# Altium schematic symbol library jlcpcb_2025_04_capacitors_extended_0603.schlib: 3668 symbols (part 10 of 20) (continued)
## CC0603JRX7R7BB823
designator C?  Capacitance: 82nF  (hidden comment: *)
Capacitor, Ceramic (MLCC), 82nF, ±5%, 16V, X7R, ±5%, SMD 0603; Manufacturer: YAGEO; Manufacturer Part Number: CC0603JRX7R7BB823; Package Size: 0603; JLCPCB Basic Part: No; JLCPCB Part Number: C519539; Supplier 1: LCSC; Category: Capacitors - MLCC; Supplier Part Number 1: C519539; Tolerance: ±5%; Voltage Rating: 16V; Temperature Coefficient: X7R; RoHS: Yes; ComponentLink1Description: Datasheet; ComponentLink1URL: https://wmsc.lcsc.com/wmsc/upload/file/pdf/v2/lcsc/2006011835_YAGEO-CC0603JRX7R7BB823_C519539.pdf; ComponentLink2Description: JLCPCB Part URL; ComponentLink2URL: https://jlcpcb.com/partdetail/C519539; ComponentLink3Description: LCSC Part URL; ComponentLink3URL: https://lcsc.com/product-detail/Multilayer-Ceramic-Capacitors-MLCC---SMD-SMT_YAGEO-YAGEO-CC0603JRX7R7BB823_C519539.html
footprint CAP-0603 (0603 (1608M) Capacitor)
pins: 1, 2

## CC0603JRX7R8BB102
designator C?  Capacitance: 1nF  (hidden comment: *)
Capacitor, Ceramic (MLCC), 1nF, ±5%, 25V, X7R, ±5%, SMD 0603; Manufacturer: YAGEO; Manufacturer Part Number: CC0603JRX7R8BB102; Package Size: 0603; JLCPCB Basic Part: No; JLCPCB Part Number: C519508; Supplier 1: LCSC; Category: Capacitors - MLCC; Supplier Part Number 1: C519508; Tolerance: ±5%; Voltage Rating: 25V; Temperature Coefficient: X7R; RoHS: Yes; ComponentLink1Description: Datasheet; ComponentLink1URL: https://wmsc.lcsc.com/wmsc/upload/file/pdf/v2/lcsc/2005181835_YAGEO-CC0603JRX7R8BB102_C519508.pdf; ComponentLink2Description: JLCPCB Part URL; ComponentLink2URL: https://jlcpcb.com/partdetail/C519508; ComponentLink3Description: LCSC Part URL; ComponentLink3URL: https://lcsc.com/product-detail/Multilayer-Ceramic-Capacitors-MLCC---SMD-SMT_YAGEO-YAGEO-CC0603JRX7R8BB102_C519508.html
footprint CAP-0603 (0603 (1608M) Capacitor)
pins: 1, 2

## CC0603JRX7R8BB103
designator C?  Capacitance: 10nF  (hidden comment: *)
Capacitor, Ceramic (MLCC), 10nF, ±5%, 25V, X7R, ±5%, SMD 0603; Manufacturer: YAGEO; Manufacturer Part Number: CC0603JRX7R8BB103; Package Size: 0603; JLCPCB Basic Part: No; JLCPCB Part Number: C519510; Supplier 1: LCSC; Category: Capacitors - MLCC; Supplier Part Number 1: C519510; Tolerance: ±5%; Voltage Rating: 25V; Temperature Coefficient: X7R; RoHS: Yes; ComponentLink1Description: Datasheet; ComponentLink1URL: https://wmsc.lcsc.com/wmsc/upload/file/pdf/v2/lcsc/2005181835_YAGEO-CC0603JRX7R8BB103_C519510.pdf; ComponentLink2Description: JLCPCB Part URL; ComponentLink2URL: https://jlcpcb.com/partdetail/C519510; ComponentLink3Description: LCSC Part URL; ComponentLink3URL: https://lcsc.com/product-detail/Multilayer-Ceramic-Capacitors-MLCC---SMD-SMT_YAGEO-YAGEO-CC0603JRX7R8BB103_C519510.html
footprint CAP-0603 (0603 (1608M) Capacitor)
pins: 1, 2

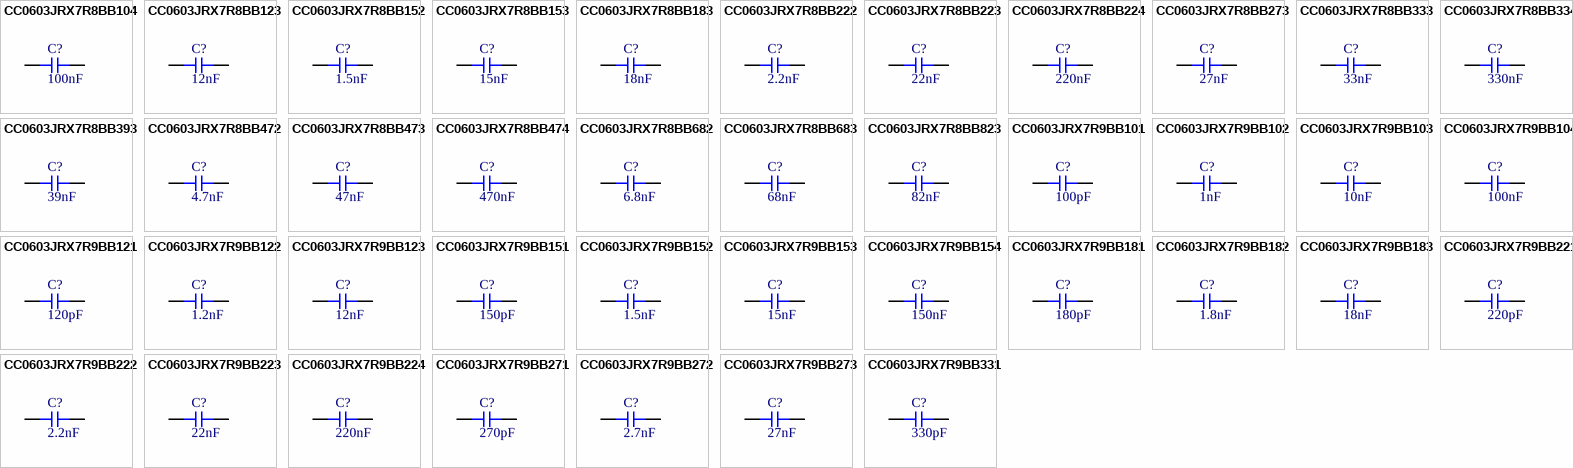
[diagram p43: symbols CC0603JRX7R8BB104 to CC0603JRX7R9BB331]

## CC0603JRX7R8BB104
designator C?  Capacitance: 100nF  (hidden comment: *)
Capacitor, Ceramic (MLCC), 100nF, ±5%, 25V, X7R, ±5%, SMD 0603; Manufacturer: YAGEO; Manufacturer Part Number: CC0603JRX7R8BB104; Package Size: 0603; JLCPCB Basic Part: No; JLCPCB Part Number: C327087; Supplier 1: LCSC; Category: Capacitors - MLCC; Supplier Part Number 1: C327087; Tolerance: ±5%; Voltage Rating: 25V; Temperature Coefficient: X7R; RoHS: Yes; ComponentLink1Description: Datasheet; ComponentLink1URL: https://wmsc.lcsc.com/wmsc/upload/file/pdf/v2/lcsc/1811141242_YAGEO-CC0603JRX7R8BB104_C327087.pdf; ComponentLink2Description: JLCPCB Part URL; ComponentLink2URL: https://jlcpcb.com/partdetail/C327087; ComponentLink3Description: LCSC Part URL; ComponentLink3URL: https://lcsc.com/product-detail/Multilayer-Ceramic-Capacitors-MLCC---SMD-SMT_YAGEO-YAGEO-CC0603JRX7R8BB104_C327087.html
footprint CAP-0603 (0603 (1608M) Capacitor)
pins: 1, 2

## CC0603JRX7R8BB123
designator C?  Capacitance: 12nF  (hidden comment: *)
Capacitor, Ceramic (MLCC), 12nF, ±5%, 25V, X7R, ±5%, SMD 0603; Manufacturer: YAGEO; Manufacturer Part Number: CC0603JRX7R8BB123; Package Size: 0603; JLCPCB Basic Part: No; JLCPCB Part Number: C519540; Supplier 1: LCSC; Category: Capacitors - MLCC; Supplier Part Number 1: C519540; Tolerance: ±5%; Voltage Rating: 25V; Temperature Coefficient: X7R; RoHS: Yes; ComponentLink1Description: Datasheet; ComponentLink1URL: https://wmsc.lcsc.com/wmsc/upload/file/pdf/v2/lcsc/2007161234_YAGEO-CC0603JRX7R8BB123_C519540.pdf; ComponentLink2Description: JLCPCB Part URL; ComponentLink2URL: https://jlcpcb.com/partdetail/C519540; ComponentLink3Description: LCSC Part URL; ComponentLink3URL: https://lcsc.com/product-detail/Multilayer-Ceramic-Capacitors-MLCC---SMD-SMT_YAGEO-YAGEO-CC0603JRX7R8BB123_C519540.html
footprint CAP-0603 (0603 (1608M) Capacitor)
pins: 1, 2

## CC0603JRX7R8BB152
designator C?  Capacitance: 1.5nF  (hidden comment: *)
Capacitor, Ceramic (MLCC), 1.5nF, ±5%, 25V, X7R, ±5%, SMD 0603; Manufacturer: YAGEO; Manufacturer Part Number: CC0603JRX7R8BB152; Package Size: 0603; JLCPCB Basic Part: No; JLCPCB Part Number: C519521; Supplier 1: LCSC; Category: Capacitors - MLCC; Supplier Part Number 1: C519521; Tolerance: ±5%; Voltage Rating: 25V; Temperature Coefficient: X7R; RoHS: Yes; ComponentLink1Description: Datasheet; ComponentLink1URL: https://wmsc.lcsc.com/wmsc/upload/file/pdf/v2/lcsc/2008031233_YAGEO-CC0603JRX7R8BB152_C519521.pdf; ComponentLink2Description: JLCPCB Part URL; ComponentLink2URL: https://jlcpcb.com/partdetail/C519521; ComponentLink3Description: LCSC Part URL; ComponentLink3URL: https://lcsc.com/product-detail/Multilayer-Ceramic-Capacitors-MLCC---SMD-SMT_YAGEO-YAGEO-CC0603JRX7R8BB152_C519521.html
footprint CAP-0603 (0603 (1608M) Capacitor)
pins: 1, 2

## CC0603JRX7R8BB153
designator C?  Capacitance: 15nF  (hidden comment: *)
Capacitor, Ceramic (MLCC), 15nF, ±5%, 25V, X7R, ±5%, SMD 0603; Manufacturer: YAGEO; Manufacturer Part Number: CC0603JRX7R8BB153; Package Size: 0603; JLCPCB Basic Part: No; JLCPCB Part Number: C519541; Supplier 1: LCSC; Category: Capacitors - MLCC; Supplier Part Number 1: C519541; Tolerance: ±5%; Voltage Rating: 25V; Temperature Coefficient: X7R; RoHS: Yes; ComponentLink1Description: Datasheet; ComponentLink1URL: https://wmsc.lcsc.com/wmsc/upload/file/pdf/v2/lcsc/2007231533_YAGEO-CC0603JRX7R8BB153_C519541.pdf; ComponentLink2Description: JLCPCB Part URL; ComponentLink2URL: https://jlcpcb.com/partdetail/C519541; ComponentLink3Description: LCSC Part URL; ComponentLink3URL: https://lcsc.com/product-detail/Multilayer-Ceramic-Capacitors-MLCC---SMD-SMT_YAGEO-YAGEO-CC0603JRX7R8BB153_C519541.html
footprint CAP-0603 (0603 (1608M) Capacitor)
pins: 1, 2

## CC0603JRX7R8BB183
designator C?  Capacitance: 18nF  (hidden comment: *)
Capacitor, Ceramic (MLCC), 18nF, ±5%, 25V, X7R, ±5%, SMD 0603; Manufacturer: YAGEO; Manufacturer Part Number: CC0603JRX7R8BB183; Package Size: 0603; JLCPCB Basic Part: No; JLCPCB Part Number: C519542; Supplier 1: LCSC; Category: Capacitors - MLCC; Supplier Part Number 1: C519542; Tolerance: ±5%; Voltage Rating: 25V; Temperature Coefficient: X7R; RoHS: Yes; ComponentLink1Description: Datasheet; ComponentLink1URL: https://wmsc.lcsc.com/wmsc/upload/file/pdf/v2/lcsc/2008031233_YAGEO-CC0603JRX7R8BB183_C519542.pdf; ComponentLink2Description: JLCPCB Part URL; ComponentLink2URL: https://jlcpcb.com/partdetail/C519542; ComponentLink3Description: LCSC Part URL; ComponentLink3URL: https://lcsc.com/product-detail/Multilayer-Ceramic-Capacitors-MLCC---SMD-SMT_YAGEO-YAGEO-CC0603JRX7R8BB183_C519542.html
footprint CAP-0603 (0603 (1608M) Capacitor)
pins: 1, 2

## CC0603JRX7R8BB222
designator C?  Capacitance: 2.2nF  (hidden comment: *)
Capacitor, Ceramic (MLCC), 2.2nF, ±5%, 25V, X7R, ±5%, SMD 0603; Manufacturer: YAGEO; Manufacturer Part Number: CC0603JRX7R8BB222; Package Size: 0603; JLCPCB Basic Part: No; JLCPCB Part Number: C519522; Supplier 1: LCSC; Category: Capacitors - MLCC; Supplier Part Number 1: C519522; Tolerance: ±5%; Voltage Rating: 25V; Temperature Coefficient: X7R; RoHS: Yes; ComponentLink1Description: Datasheet; ComponentLink1URL: https://wmsc.lcsc.com/wmsc/upload/file/pdf/v2/lcsc/2008031233_YAGEO-CC0603JRX7R8BB222_C519522.pdf; ComponentLink2Description: JLCPCB Part URL; ComponentLink2URL: https://jlcpcb.com/partdetail/C519522; ComponentLink3Description: LCSC Part URL; ComponentLink3URL: https://lcsc.com/product-detail/Multilayer-Ceramic-Capacitors-MLCC---SMD-SMT_YAGEO-YAGEO-CC0603JRX7R8BB222_C519522.html
footprint CAP-0603 (0603 (1608M) Capacitor)
pins: 1, 2

## CC0603JRX7R8BB223
designator C?  Capacitance: 22nF  (hidden comment: *)
Capacitor, Ceramic (MLCC), 22nF, ±5%, 25V, X7R, ±5%, SMD 0603; Manufacturer: YAGEO; Manufacturer Part Number: CC0603JRX7R8BB223; Package Size: 0603; JLCPCB Basic Part: No; JLCPCB Part Number: C327290; Supplier 1: LCSC; Category: Capacitors - MLCC; Supplier Part Number 1: C327290; Tolerance: ±5%; Voltage Rating: 25V; Temperature Coefficient: X7R; RoHS: Yes; ComponentLink1Description: Datasheet; ComponentLink1URL: https://wmsc.lcsc.com/wmsc/upload/file/pdf/v2/lcsc/1811141233_YAGEO-CC0603JRX7R8BB223_C327290.pdf; ComponentLink2Description: JLCPCB Part URL; ComponentLink2URL: https://jlcpcb.com/partdetail/C327290; ComponentLink3Description: LCSC Part URL; ComponentLink3URL: https://lcsc.com/product-detail/Multilayer-Ceramic-Capacitors-MLCC---SMD-SMT_YAGEO-YAGEO-CC0603JRX7R8BB223_C327290.html
footprint CAP-0603 (0603 (1608M) Capacitor)
pins: 1, 2

## CC0603JRX7R8BB224
designator C?  Capacitance: 220nF  (hidden comment: *)
Capacitor, Ceramic (MLCC), 220nF, ±5%, 25V, X7R, ±5%, SMD 0603; Manufacturer: YAGEO; Manufacturer Part Number: CC0603JRX7R8BB224; Package Size: 0603; JLCPCB Basic Part: No; JLCPCB Part Number: C519574; Supplier 1: LCSC; Category: Capacitors - MLCC; Supplier Part Number 1: C519574; Tolerance: ±5%; Voltage Rating: 25V; Temperature Coefficient: X7R; RoHS: Yes; ComponentLink1Description: Datasheet; ComponentLink1URL: https://wmsc.lcsc.com/wmsc/upload/file/pdf/v2/lcsc/2007231534_YAGEO-CC0603JRX7R8BB224_C519574.pdf; ComponentLink2Description: JLCPCB Part URL; ComponentLink2URL: https://jlcpcb.com/partdetail/C519574; ComponentLink3Description: LCSC Part URL; ComponentLink3URL: https://lcsc.com/product-detail/Multilayer-Ceramic-Capacitors-MLCC---SMD-SMT_YAGEO-YAGEO-CC0603JRX7R8BB224_C519574.html
footprint CAP-0603 (0603 (1608M) Capacitor)
pins: 1, 2

## CC0603JRX7R8BB273
designator C?  Capacitance: 27nF  (hidden comment: *)
Capacitor, Ceramic (MLCC), 27nF, ±5%, 25V, X7R, ±5%, SMD 0603; Manufacturer: YAGEO; Manufacturer Part Number: CC0603JRX7R8BB273; Package Size: 0603; JLCPCB Basic Part: No; JLCPCB Part Number: C519543; Supplier 1: LCSC; Category: Capacitors - MLCC; Supplier Part Number 1: C519543; Tolerance: ±5%; Voltage Rating: 25V; Temperature Coefficient: X7R; RoHS: Yes; ComponentLink1Description: Datasheet; ComponentLink1URL: https://wmsc.lcsc.com/wmsc/upload/file/pdf/v2/lcsc/2007231533_YAGEO-CC0603JRX7R8BB273_C519543.pdf; ComponentLink2Description: JLCPCB Part URL; ComponentLink2URL: https://jlcpcb.com/partdetail/C519543; ComponentLink3Description: LCSC Part URL; ComponentLink3URL: https://lcsc.com/product-detail/Multilayer-Ceramic-Capacitors-MLCC---SMD-SMT_YAGEO-YAGEO-CC0603JRX7R8BB273_C519543.html
footprint CAP-0603 (0603 (1608M) Capacitor)
pins: 1, 2

## CC0603JRX7R8BB333
designator C?  Capacitance: 33nF  (hidden comment: *)
Capacitor, Ceramic (MLCC), 33nF, ±5%, 25V, X7R, ±5%, SMD 0603; Manufacturer: YAGEO; Manufacturer Part Number: CC0603JRX7R8BB333; Package Size: 0603; JLCPCB Basic Part: No; JLCPCB Part Number: C519544; Supplier 1: LCSC; Category: Capacitors - MLCC; Supplier Part Number 1: C519544; Tolerance: ±5%; Voltage Rating: 25V; Temperature Coefficient: X7R; RoHS: Yes; ComponentLink1Description: Datasheet; ComponentLink1URL: https://wmsc.lcsc.com/wmsc/upload/file/pdf/v2/lcsc/2006011835_YAGEO-CC0603JRX7R8BB333_C519544.pdf; ComponentLink2Description: JLCPCB Part URL; ComponentLink2URL: https://jlcpcb.com/partdetail/C519544; ComponentLink3Description: LCSC Part URL; ComponentLink3URL: https://lcsc.com/product-detail/Multilayer-Ceramic-Capacitors-MLCC---SMD-SMT_YAGEO-YAGEO-CC0603JRX7R8BB333_C519544.html
footprint CAP-0603 (0603 (1608M) Capacitor)
pins: 1, 2

## CC0603JRX7R8BB334
designator C?  Capacitance: 330nF  (hidden comment: *)
Capacitor, Ceramic (MLCC), 330nF, ±5%, 25V, X7R, ±5%, SMD 0603; Manufacturer: YAGEO; Manufacturer Part Number: CC0603JRX7R8BB334; Package Size: 0603; JLCPCB Basic Part: No; JLCPCB Part Number: C519579; Supplier 1: LCSC; Category: Capacitors - MLCC; Supplier Part Number 1: C519579; Tolerance: ±5%; Voltage Rating: 25V; Temperature Coefficient: X7R; RoHS: Yes; ComponentLink1Description: Datasheet; ComponentLink1URL: https://wmsc.lcsc.com/wmsc/upload/file/pdf/v2/lcsc/2006011835_YAGEO-CC0603JRX7R8BB334_C519579.pdf; ComponentLink2Description: JLCPCB Part URL; ComponentLink2URL: https://jlcpcb.com/partdetail/C519579; ComponentLink3Description: LCSC Part URL; ComponentLink3URL: https://lcsc.com/product-detail/Multilayer-Ceramic-Capacitors-MLCC---SMD-SMT_YAGEO-YAGEO-CC0603JRX7R8BB334_C519579.html
footprint CAP-0603 (0603 (1608M) Capacitor)
pins: 1, 2

## CC0603JRX7R8BB393
designator C?  Capacitance: 39nF  (hidden comment: *)
Capacitor, Ceramic (MLCC), 39nF, ±5%, 25V, X7R, ±5%, SMD 0603; Manufacturer: YAGEO; Manufacturer Part Number: CC0603JRX7R8BB393; Package Size: 0603; JLCPCB Basic Part: No; JLCPCB Part Number: C519545; Supplier 1: LCSC; Category: Capacitors - MLCC; Supplier Part Number 1: C519545; Tolerance: ±5%; Voltage Rating: 25V; Temperature Coefficient: X7R; RoHS: Yes; ComponentLink1Description: Datasheet; ComponentLink1URL: https://wmsc.lcsc.com/wmsc/upload/file/pdf/v2/lcsc/2010251434_YAGEO-CC0603JRX7R8BB393_C519545.pdf; ComponentLink2Description: JLCPCB Part URL; ComponentLink2URL: https://jlcpcb.com/partdetail/C519545; ComponentLink3Description: LCSC Part URL; ComponentLink3URL: https://lcsc.com/product-detail/Multilayer-Ceramic-Capacitors-MLCC---SMD-SMT_YAGEO-YAGEO-CC0603JRX7R8BB393_C519545.html
footprint CAP-0603 (0603 (1608M) Capacitor)
pins: 1, 2

## CC0603JRX7R8BB472
designator C?  Capacitance: 4.7nF  (hidden comment: *)
Capacitor, Ceramic (MLCC), 4.7nF, ±5%, 25V, X7R, ±5%, SMD 0603; Manufacturer: YAGEO; Manufacturer Part Number: CC0603JRX7R8BB472; Package Size: 0603; JLCPCB Basic Part: No; JLCPCB Part Number: C519524; Supplier 1: LCSC; Category: Capacitors - MLCC; Supplier Part Number 1: C519524; Tolerance: ±5%; Voltage Rating: 25V; Temperature Coefficient: X7R; RoHS: Yes; ComponentLink1Description: Datasheet; ComponentLink1URL: https://wmsc.lcsc.com/wmsc/upload/file/pdf/v2/lcsc/2008031233_YAGEO-CC0603JRX7R8BB472_C519524.pdf; ComponentLink2Description: JLCPCB Part URL; ComponentLink2URL: https://jlcpcb.com/partdetail/C519524; ComponentLink3Description: LCSC Part URL; ComponentLink3URL: https://lcsc.com/product-detail/Multilayer-Ceramic-Capacitors-MLCC---SMD-SMT_YAGEO-YAGEO-CC0603JRX7R8BB472_C519524.html
footprint CAP-0603 (0603 (1608M) Capacitor)
pins: 1, 2

## CC0603JRX7R8BB473
designator C?  Capacitance: 47nF  (hidden comment: *)
Capacitor, Ceramic (MLCC), 47nF, ±5%, 25V, X7R, ±5%, SMD 0603; Manufacturer: YAGEO; Manufacturer Part Number: CC0603JRX7R8BB473; Package Size: 0603; JLCPCB Basic Part: No; JLCPCB Part Number: C519546; Supplier 1: LCSC; Category: Capacitors - MLCC; Supplier Part Number 1: C519546; Tolerance: ±5%; Voltage Rating: 25V; Temperature Coefficient: X7R; RoHS: Yes; ComponentLink1Description: Datasheet; ComponentLink1URL: https://wmsc.lcsc.com/wmsc/upload/file/pdf/v2/lcsc/2007231533_YAGEO-CC0603JRX7R8BB473_C519546.pdf; ComponentLink2Description: JLCPCB Part URL; ComponentLink2URL: https://jlcpcb.com/partdetail/C519546; ComponentLink3Description: LCSC Part URL; ComponentLink3URL: https://lcsc.com/product-detail/Multilayer-Ceramic-Capacitors-MLCC---SMD-SMT_YAGEO-YAGEO-CC0603JRX7R8BB473_C519546.html
footprint CAP-0603 (0603 (1608M) Capacitor)
pins: 1, 2

## CC0603JRX7R8BB474
designator C?  Capacitance: 470nF  (hidden comment: *)
Capacitor, Ceramic (MLCC), 470nF, ±5%, 25V, X7R, ±5%, SMD 0603; Manufacturer: YAGEO; Manufacturer Part Number: CC0603JRX7R8BB474; Package Size: 0603; JLCPCB Basic Part: No; JLCPCB Part Number: C519576; Supplier 1: LCSC; Category: Capacitors - MLCC; Supplier Part Number 1: C519576; Tolerance: ±5%; Voltage Rating: 25V; Temperature Coefficient: X7R; RoHS: Yes; ComponentLink1Description: Datasheet; ComponentLink1URL: https://wmsc.lcsc.com/wmsc/upload/file/pdf/v2/lcsc/2006011835_YAGEO-CC0603JRX7R8BB474_C519576.pdf; ComponentLink2Description: JLCPCB Part URL; ComponentLink2URL: https://jlcpcb.com/partdetail/C519576; ComponentLink3Description: LCSC Part URL; ComponentLink3URL: https://lcsc.com/product-detail/Multilayer-Ceramic-Capacitors-MLCC---SMD-SMT_YAGEO-YAGEO-CC0603JRX7R8BB474_C519576.html
footprint CAP-0603 (0603 (1608M) Capacitor)
pins: 1, 2

## CC0603JRX7R8BB682
designator C?  Capacitance: 6.8nF  (hidden comment: *)
Capacitor, Ceramic (MLCC), 6.8nF, ±5%, 25V, X7R, ±5%, SMD 0603; Manufacturer: YAGEO; Manufacturer Part Number: CC0603JRX7R8BB682; Package Size: 0603; JLCPCB Basic Part: No; JLCPCB Part Number: C519525; Supplier 1: LCSC; Category: Capacitors - MLCC; Supplier Part Number 1: C519525; Tolerance: ±5%; Voltage Rating: 25V; Temperature Coefficient: X7R; RoHS: Yes; ComponentLink1Description: Datasheet; ComponentLink1URL: https://wmsc.lcsc.com/wmsc/upload/file/pdf/v2/lcsc/2006011835_YAGEO-CC0603JRX7R8BB682_C519525.pdf; ComponentLink2Description: JLCPCB Part URL; ComponentLink2URL: https://jlcpcb.com/partdetail/C519525; ComponentLink3Description: LCSC Part URL; ComponentLink3URL: https://lcsc.com/product-detail/Multilayer-Ceramic-Capacitors-MLCC---SMD-SMT_YAGEO-YAGEO-CC0603JRX7R8BB682_C519525.html
footprint CAP-0603 (0603 (1608M) Capacitor)
pins: 1, 2

## CC0603JRX7R8BB683
designator C?  Capacitance: 68nF  (hidden comment: *)
Capacitor, Ceramic (MLCC), 68nF, ±5%, 25V, X7R, ±5%, SMD 0603; Manufacturer: YAGEO; Manufacturer Part Number: CC0603JRX7R8BB683; Package Size: 0603; JLCPCB Basic Part: No; JLCPCB Part Number: C519547; Supplier 1: LCSC; Category: Capacitors - MLCC; Supplier Part Number 1: C519547; Tolerance: ±5%; Voltage Rating: 25V; Temperature Coefficient: X7R; RoHS: Yes; ComponentLink1Description: Datasheet; ComponentLink1URL: https://wmsc.lcsc.com/wmsc/upload/file/pdf/v2/lcsc/2006011835_YAGEO-CC0603JRX7R8BB683_C519547.pdf; ComponentLink2Description: JLCPCB Part URL; ComponentLink2URL: https://jlcpcb.com/partdetail/C519547; ComponentLink3Description: LCSC Part URL; ComponentLink3URL: https://lcsc.com/product-detail/Multilayer-Ceramic-Capacitors-MLCC---SMD-SMT_YAGEO-YAGEO-CC0603JRX7R8BB683_C519547.html
footprint CAP-0603 (0603 (1608M) Capacitor)
pins: 1, 2

## CC0603JRX7R8BB823
designator C?  Capacitance: 82nF  (hidden comment: *)
Capacitor, Ceramic (MLCC), 82nF, ±5%, 25V, X7R, ±5%, SMD 0603; Manufacturer: YAGEO; Manufacturer Part Number: CC0603JRX7R8BB823; Package Size: 0603; JLCPCB Basic Part: No; JLCPCB Part Number: C519548; Supplier 1: LCSC; Category: Capacitors - MLCC; Supplier Part Number 1: C519548; Tolerance: ±5%; Voltage Rating: 25V; Temperature Coefficient: X7R; RoHS: Yes; ComponentLink1Description: Datasheet; ComponentLink1URL: https://wmsc.lcsc.com/wmsc/upload/file/pdf/v2/lcsc/2009111706_YAGEO-CC0603JRX7R8BB823_C519548.pdf; ComponentLink2Description: JLCPCB Part URL; ComponentLink2URL: https://jlcpcb.com/partdetail/C519548; ComponentLink3Description: LCSC Part URL; ComponentLink3URL: https://lcsc.com/product-detail/Multilayer-Ceramic-Capacitors-MLCC---SMD-SMT_YAGEO-YAGEO-CC0603JRX7R8BB823_C519548.html
footprint CAP-0603 (0603 (1608M) Capacitor)
pins: 1, 2

## CC0603JRX7R9BB101
designator C?  Capacitance: 100pF  (hidden comment: *)
Capacitor, Ceramic (MLCC), 100pF, ±5%, 50V, X7R, ±5%, SMD 0603; Manufacturer: YAGEO; Manufacturer Part Number: CC0603JRX7R9BB101; Package Size: 0603; JLCPCB Basic Part: No; JLCPCB Part Number: C519513; Supplier 1: LCSC; Category: Capacitors - MLCC; Supplier Part Number 1: C519513; Tolerance: ±5%; Voltage Rating: 50V; Temperature Coefficient: X7R; RoHS: Yes; ComponentLink1Description: Datasheet; ComponentLink1URL: https://wmsc.lcsc.com/wmsc/upload/file/pdf/v2/lcsc/2005141203_YAGEO-CC0603JRX7R9BB101_C519513.pdf; ComponentLink2Description: JLCPCB Part URL; ComponentLink2URL: https://jlcpcb.com/partdetail/C519513; ComponentLink3Description: LCSC Part URL; ComponentLink3URL: https://lcsc.com/product-detail/Multilayer-Ceramic-Capacitors-MLCC---SMD-SMT_YAGEO-YAGEO-CC0603JRX7R9BB101_C519513.html
footprint CAP-0603 (0603 (1608M) Capacitor)
pins: 1, 2

## CC0603JRX7R9BB102
designator C?  Capacitance: 1nF  (hidden comment: *)
Capacitor, Ceramic (MLCC), 1nF, ±5%, 50V, X7R, ±5%, SMD 0603; Manufacturer: YAGEO; Manufacturer Part Number: CC0603JRX7R9BB102; Package Size: 0603; JLCPCB Basic Part: No; JLCPCB Part Number: C131031; Supplier 1: LCSC; Category: Capacitors - MLCC; Supplier Part Number 1: C131031; Tolerance: ±5%; Voltage Rating: 50V; Temperature Coefficient: X7R; RoHS: Yes; ComponentLink1Description: Datasheet; ComponentLink1URL: https://wmsc.lcsc.com/wmsc/upload/file/pdf/v2/lcsc/1811082114_YAGEO-CC0603JRX7R9BB102_C131031.pdf; ComponentLink2Description: JLCPCB Part URL; ComponentLink2URL: https://jlcpcb.com/partdetail/C131031; ComponentLink3Description: LCSC Part URL; ComponentLink3URL: https://lcsc.com/product-detail/Multilayer-Ceramic-Capacitors-MLCC---SMD-SMT_YAGEO-YAGEO-CC0603JRX7R9BB102_C131031.html
footprint CAP-0603 (0603 (1608M) Capacitor)
pins: 1, 2

## CC0603JRX7R9BB103
designator C?  Capacitance: 10nF  (hidden comment: *)
Capacitor, Ceramic (MLCC), 10nF, ±5%, 50V, X7R, ±5%, SMD 0603; Manufacturer: YAGEO; Manufacturer Part Number: CC0603JRX7R9BB103; Package Size: 0603; JLCPCB Basic Part: No; JLCPCB Part Number: C115056; Supplier 1: LCSC; Category: Capacitors - MLCC; Supplier Part Number 1: C115056; Tolerance: ±5%; Voltage Rating: 50V; Temperature Coefficient: X7R; RoHS: Yes; ComponentLink1Description: Datasheet; ComponentLink1URL: https://wmsc.lcsc.com/wmsc/upload/file/pdf/v2/lcsc/2304140030_YAGEO-CC0603JRX7R9BB103_C115056.pdf; ComponentLink2Description: JLCPCB Part URL; ComponentLink2URL: https://jlcpcb.com/partdetail/C115056; ComponentLink3Description: LCSC Part URL; ComponentLink3URL: https://lcsc.com/product-detail/Multilayer-Ceramic-Capacitors-MLCC---SMD-SMT_YAGEO-YAGEO-CC0603JRX7R9BB103_C115056.html
footprint CAP-0603 (0603 (1608M) Capacitor)
pins: 1, 2

## CC0603JRX7R9BB104
designator C?  Capacitance: 100nF  (hidden comment: *)
Capacitor, Ceramic (MLCC), 100nF, ±5%, 50V, X7R, ±5%, SMD 0603; Manufacturer: YAGEO; Manufacturer Part Number: CC0603JRX7R9BB104; Package Size: 0603; JLCPCB Basic Part: No; JLCPCB Part Number: C91183; Supplier 1: LCSC; Category: Capacitors - MLCC; Supplier Part Number 1: C91183; Tolerance: ±5%; Voltage Rating: 50V; Temperature Coefficient: X7R; RoHS: Yes; ComponentLink1Description: Datasheet; ComponentLink1URL: https://wmsc.lcsc.com/wmsc/upload/file/pdf/v2/lcsc/2304140030_YAGEO-CC0603JRX7R9BB104_C91183.pdf; ComponentLink2Description: JLCPCB Part URL; ComponentLink2URL: https://jlcpcb.com/partdetail/C91183; ComponentLink3Description: LCSC Part URL; ComponentLink3URL: https://lcsc.com/product-detail/Multilayer-Ceramic-Capacitors-MLCC---SMD-SMT_YAGEO-YAGEO-CC0603JRX7R9BB104_C91183.html
footprint CAP-0603 (0603 (1608M) Capacitor)
pins: 1, 2

## CC0603JRX7R9BB121
designator C?  Capacitance: 120pF  (hidden comment: *)
Capacitor, Ceramic (MLCC), 120pF, ±5%, 50V, X7R, ±5%, SMD 0603; Manufacturer: YAGEO; Manufacturer Part Number: CC0603JRX7R9BB121; Package Size: 0603; JLCPCB Basic Part: No; JLCPCB Part Number: C519514; Supplier 1: LCSC; Category: Capacitors - MLCC; Supplier Part Number 1: C519514; Tolerance: ±5%; Voltage Rating: 50V; Temperature Coefficient: X7R; RoHS: Yes; ComponentLink1Description: Datasheet; ComponentLink1URL: https://wmsc.lcsc.com/wmsc/upload/file/pdf/v2/lcsc/2012162139_YAGEO-CC0603JRX7R9BB121_C519514.pdf; ComponentLink2Description: JLCPCB Part URL; ComponentLink2URL: https://jlcpcb.com/partdetail/C519514; ComponentLink3Description: LCSC Part URL; ComponentLink3URL: https://lcsc.com/product-detail/Multilayer-Ceramic-Capacitors-MLCC---SMD-SMT_YAGEO-YAGEO-CC0603JRX7R9BB121_C519514.html
footprint CAP-0603 (0603 (1608M) Capacitor)
pins: 1, 2

## CC0603JRX7R9BB122
designator C?  Capacitance: 1.2nF  (hidden comment: *)
Capacitor, Ceramic (MLCC), 1.2nF, ±5%, 50V, X7R, ±5%, SMD 0603; Manufacturer: YAGEO; Manufacturer Part Number: CC0603JRX7R9BB122; Package Size: 0603; JLCPCB Basic Part: No; JLCPCB Part Number: C519526; Supplier 1: LCSC; Category: Capacitors - MLCC; Supplier Part Number 1: C519526; Tolerance: ±5%; Voltage Rating: 50V; Temperature Coefficient: X7R; RoHS: Yes; ComponentLink1Description: Datasheet; ComponentLink1URL: https://wmsc.lcsc.com/wmsc/upload/file/pdf/v2/lcsc/2005181835_YAGEO-CC0603JRX7R9BB122_C519526.pdf; ComponentLink2Description: JLCPCB Part URL; ComponentLink2URL: https://jlcpcb.com/partdetail/C519526; ComponentLink3Description: LCSC Part URL; ComponentLink3URL: https://lcsc.com/product-detail/Multilayer-Ceramic-Capacitors-MLCC---SMD-SMT_YAGEO-YAGEO-CC0603JRX7R9BB122_C519526.html
footprint CAP-0603 (0603 (1608M) Capacitor)
pins: 1, 2

## CC0603JRX7R9BB123
designator C?  Capacitance: 12nF  (hidden comment: *)
Capacitor, Ceramic (MLCC), 12nF, ±5%, 50V, X7R, ±5%, SMD 0603; Manufacturer: YAGEO; Manufacturer Part Number: CC0603JRX7R9BB123; Package Size: 0603; JLCPCB Basic Part: No; JLCPCB Part Number: C519549; Supplier 1: LCSC; Category: Capacitors - MLCC; Supplier Part Number 1: C519549; Tolerance: ±5%; Voltage Rating: 50V; Temperature Coefficient: X7R; RoHS: Yes; ComponentLink1Description: Datasheet; ComponentLink1URL: https://wmsc.lcsc.com/wmsc/upload/file/pdf/v2/lcsc/2005141203_YAGEO-CC0603JRX7R9BB123_C519549.pdf; ComponentLink2Description: JLCPCB Part URL; ComponentLink2URL: https://jlcpcb.com/partdetail/C519549; ComponentLink3Description: LCSC Part URL; ComponentLink3URL: https://lcsc.com/product-detail/Multilayer-Ceramic-Capacitors-MLCC---SMD-SMT_YAGEO-YAGEO-CC0603JRX7R9BB123_C519549.html
footprint CAP-0603 (0603 (1608M) Capacitor)
pins: 1, 2

## CC0603JRX7R9BB151
designator C?  Capacitance: 150pF  (hidden comment: *)
Capacitor, Ceramic (MLCC), 150pF, ±5%, 50V, X7R, ±5%, SMD 0603; Manufacturer: YAGEO; Manufacturer Part Number: CC0603JRX7R9BB151; Package Size: 0603; JLCPCB Basic Part: No; JLCPCB Part Number: C519515; Supplier 1: LCSC; Category: Capacitors - MLCC; Supplier Part Number 1: C519515; Tolerance: ±5%; Voltage Rating: 50V; Temperature Coefficient: X7R; RoHS: Yes; ComponentLink1Description: Datasheet; ComponentLink1URL: https://wmsc.lcsc.com/wmsc/upload/file/pdf/v2/lcsc/2008122133_YAGEO-CC0603JRX7R9BB151_C519515.pdf; ComponentLink2Description: JLCPCB Part URL; ComponentLink2URL: https://jlcpcb.com/partdetail/C519515; ComponentLink3Description: LCSC Part URL; ComponentLink3URL: https://lcsc.com/product-detail/Multilayer-Ceramic-Capacitors-MLCC---SMD-SMT_YAGEO-YAGEO-CC0603JRX7R9BB151_C519515.html
footprint CAP-0603 (0603 (1608M) Capacitor)
pins: 1, 2

## CC0603JRX7R9BB152
designator C?  Capacitance: 1.5nF  (hidden comment: *)
Capacitor, Ceramic (MLCC), 1.5nF, ±5%, 50V, X7R, ±5%, SMD 0603; Manufacturer: YAGEO; Manufacturer Part Number: CC0603JRX7R9BB152; Package Size: 0603; JLCPCB Basic Part: No; JLCPCB Part Number: C519527; Supplier 1: LCSC; Category: Capacitors - MLCC; Supplier Part Number 1: C519527; Tolerance: ±5%; Voltage Rating: 50V; Temperature Coefficient: X7R; RoHS: Yes; ComponentLink1Description: Datasheet; ComponentLink1URL: https://wmsc.lcsc.com/wmsc/upload/file/pdf/v2/lcsc/2006070931_YAGEO-CC0603JRX7R9BB152_C519527.pdf; ComponentLink2Description: JLCPCB Part URL; ComponentLink2URL: https://jlcpcb.com/partdetail/C519527; ComponentLink3Description: LCSC Part URL; ComponentLink3URL: https://lcsc.com/product-detail/Multilayer-Ceramic-Capacitors-MLCC---SMD-SMT_YAGEO-YAGEO-CC0603JRX7R9BB152_C519527.html
footprint CAP-0603 (0603 (1608M) Capacitor)
pins: 1, 2

## CC0603JRX7R9BB153
designator C?  Capacitance: 15nF  (hidden comment: *)
Capacitor, Ceramic (MLCC), 15nF, ±5%, 50V, X7R, ±5%, SMD 0603; Manufacturer: YAGEO; Manufacturer Part Number: CC0603JRX7R9BB153; Package Size: 0603; JLCPCB Basic Part: No; JLCPCB Part Number: C519550; Supplier 1: LCSC; Category: Capacitors - MLCC; Supplier Part Number 1: C519550; Tolerance: ±5%; Voltage Rating: 50V; Temperature Coefficient: X7R; RoHS: Yes; ComponentLink1Description: Datasheet; ComponentLink1URL: https://wmsc.lcsc.com/wmsc/upload/file/pdf/v2/lcsc/2007231533_YAGEO-CC0603JRX7R9BB153_C519550.pdf; ComponentLink2Description: JLCPCB Part URL; ComponentLink2URL: https://jlcpcb.com/partdetail/C519550; ComponentLink3Description: LCSC Part URL; ComponentLink3URL: https://lcsc.com/product-detail/Multilayer-Ceramic-Capacitors-MLCC---SMD-SMT_YAGEO-YAGEO-CC0603JRX7R9BB153_C519550.html
footprint CAP-0603 (0603 (1608M) Capacitor)
pins: 1, 2

## CC0603JRX7R9BB154
designator C?  Capacitance: 150nF  (hidden comment: *)
Capacitor, Ceramic (MLCC), 150nF, ±5%, 50V, X7R, ±5%, SMD 0603; Manufacturer: YAGEO; Manufacturer Part Number: CC0603JRX7R9BB154; Package Size: 0603; JLCPCB Basic Part: No; JLCPCB Part Number: C519580; Supplier 1: LCSC; Category: Capacitors - MLCC; Supplier Part Number 1: C519580; Tolerance: ±5%; Voltage Rating: 50V; Temperature Coefficient: X7R; RoHS: Yes; ComponentLink1Description: Datasheet; ComponentLink1URL: https://wmsc.lcsc.com/wmsc/upload/file/pdf/v2/lcsc/2008122133_YAGEO-CC0603JRX7R9BB154_C519580.pdf; ComponentLink2Description: JLCPCB Part URL; ComponentLink2URL: https://jlcpcb.com/partdetail/C519580; ComponentLink3Description: LCSC Part URL; ComponentLink3URL: https://lcsc.com/product-detail/Multilayer-Ceramic-Capacitors-MLCC---SMD-SMT_YAGEO-YAGEO-CC0603JRX7R9BB154_C519580.html
footprint CAP-0603 (0603 (1608M) Capacitor)
pins: 1, 2

## CC0603JRX7R9BB181
designator C?  Capacitance: 180pF  (hidden comment: *)
Capacitor, Ceramic (MLCC), 180pF, ±5%, 50V, X7R, ±5%, SMD 0603; Manufacturer: YAGEO; Manufacturer Part Number: CC0603JRX7R9BB181; Package Size: 0603; JLCPCB Basic Part: No; JLCPCB Part Number: C519516; Supplier 1: LCSC; Category: Capacitors - MLCC; Supplier Part Number 1: C519516; Tolerance: ±5%; Voltage Rating: 50V; Temperature Coefficient: X7R; RoHS: Yes; ComponentLink1Description: Datasheet; ComponentLink1URL: https://wmsc.lcsc.com/wmsc/upload/file/pdf/v2/lcsc/2008191833_YAGEO-CC0603JRX7R9BB181_C519516.pdf; ComponentLink2Description: JLCPCB Part URL; ComponentLink2URL: https://jlcpcb.com/partdetail/C519516; ComponentLink3Description: LCSC Part URL; ComponentLink3URL: https://lcsc.com/product-detail/Multilayer-Ceramic-Capacitors-MLCC---SMD-SMT_YAGEO-YAGEO-CC0603JRX7R9BB181_C519516.html
footprint CAP-0603 (0603 (1608M) Capacitor)
pins: 1, 2

## CC0603JRX7R9BB182
designator C?  Capacitance: 1.8nF  (hidden comment: *)
Capacitor, Ceramic (MLCC), 1.8nF, ±5%, 50V, X7R, ±5%, SMD 0603; Manufacturer: YAGEO; Manufacturer Part Number: CC0603JRX7R9BB182; Package Size: 0603; JLCPCB Basic Part: No; JLCPCB Part Number: C519528; Supplier 1: LCSC; Category: Capacitors - MLCC; Supplier Part Number 1: C519528; Tolerance: ±5%; Voltage Rating: 50V; Temperature Coefficient: X7R; RoHS: Yes; ComponentLink1Description: Datasheet; ComponentLink1URL: https://wmsc.lcsc.com/wmsc/upload/file/pdf/v2/lcsc/2009111706_YAGEO-CC0603JRX7R9BB182_C519528.pdf; ComponentLink2Description: JLCPCB Part URL; ComponentLink2URL: https://jlcpcb.com/partdetail/C519528; ComponentLink3Description: LCSC Part URL; ComponentLink3URL: https://lcsc.com/product-detail/Multilayer-Ceramic-Capacitors-MLCC---SMD-SMT_YAGEO-YAGEO-CC0603JRX7R9BB182_C519528.html
footprint CAP-0603 (0603 (1608M) Capacitor)
pins: 1, 2

## CC0603JRX7R9BB183
designator C?  Capacitance: 18nF  (hidden comment: *)
Capacitor, Ceramic (MLCC), 18nF, ±5%, 50V, X7R, ±5%, SMD 0603; Manufacturer: YAGEO; Manufacturer Part Number: CC0603JRX7R9BB183; Package Size: 0603; JLCPCB Basic Part: No; JLCPCB Part Number: C519551; Supplier 1: LCSC; Category: Capacitors - MLCC; Supplier Part Number 1: C519551; Tolerance: ±5%; Voltage Rating: 50V; Temperature Coefficient: X7R; RoHS: Yes; ComponentLink1Description: Datasheet; ComponentLink1URL: https://wmsc.lcsc.com/wmsc/upload/file/pdf/v2/lcsc/2005181835_YAGEO-CC0603JRX7R9BB183_C519551.pdf; ComponentLink2Description: JLCPCB Part URL; ComponentLink2URL: https://jlcpcb.com/partdetail/C519551; ComponentLink3Description: LCSC Part URL; ComponentLink3URL: https://lcsc.com/product-detail/Multilayer-Ceramic-Capacitors-MLCC---SMD-SMT_YAGEO-YAGEO-CC0603JRX7R9BB183_C519551.html
footprint CAP-0603 (0603 (1608M) Capacitor)
pins: 1, 2

## CC0603JRX7R9BB221
designator C?  Capacitance: 220pF  (hidden comment: *)
Capacitor, Ceramic (MLCC), 220pF, ±5%, 50V, X7R, ±5%, SMD 0603; Manufacturer: YAGEO; Manufacturer Part Number: CC0603JRX7R9BB221; Package Size: 0603; JLCPCB Basic Part: No; JLCPCB Part Number: C327270; Supplier 1: LCSC; Category: Capacitors - MLCC; Supplier Part Number 1: C327270; Tolerance: ±5%; Voltage Rating: 50V; Temperature Coefficient: X7R; RoHS: Yes; ComponentLink1Description: Datasheet; ComponentLink1URL: https://wmsc.lcsc.com/wmsc/upload/file/pdf/v2/lcsc/1811141225_YAGEO-CC0603JRX7R9BB221_C327270.pdf; ComponentLink2Description: JLCPCB Part URL; ComponentLink2URL: https://jlcpcb.com/partdetail/C327270; ComponentLink3Description: LCSC Part URL; ComponentLink3URL: https://lcsc.com/product-detail/Multilayer-Ceramic-Capacitors-MLCC---SMD-SMT_YAGEO-YAGEO-CC0603JRX7R9BB221_C327270.html
footprint CAP-0603 (0603 (1608M) Capacitor)
pins: 1, 2

## CC0603JRX7R9BB222
designator C?  Capacitance: 2.2nF  (hidden comment: *)
Capacitor, Ceramic (MLCC), 2.2nF, ±5%, 50V, X7R, ±5%, SMD 0603; Manufacturer: YAGEO; Manufacturer Part Number: CC0603JRX7R9BB222; Package Size: 0603; JLCPCB Basic Part: No; JLCPCB Part Number: C115059; Supplier 1: LCSC; Category: Capacitors - MLCC; Supplier Part Number 1: C115059; Tolerance: ±5%; Voltage Rating: 50V; Temperature Coefficient: X7R; RoHS: Yes; ComponentLink1Description: Datasheet; ComponentLink1URL: https://wmsc.lcsc.com/wmsc/upload/file/pdf/v2/lcsc/2304140030_YAGEO-CC0603JRX7R9BB222_C115059.pdf; ComponentLink2Description: JLCPCB Part URL; ComponentLink2URL: https://jlcpcb.com/partdetail/C115059; ComponentLink3Description: LCSC Part URL; ComponentLink3URL: https://lcsc.com/product-detail/Multilayer-Ceramic-Capacitors-MLCC---SMD-SMT_YAGEO-YAGEO-CC0603JRX7R9BB222_C115059.html
footprint CAP-0603 (0603 (1608M) Capacitor)
pins: 1, 2

## CC0603JRX7R9BB223
designator C?  Capacitance: 22nF  (hidden comment: *)
Capacitor, Ceramic (MLCC), 22nF, ±5%, 50V, X7R, ±5%, SMD 0603; Manufacturer: YAGEO; Manufacturer Part Number: CC0603JRX7R9BB223; Package Size: 0603; JLCPCB Basic Part: No; JLCPCB Part Number: C277528; Supplier 1: LCSC; Category: Capacitors - MLCC; Supplier Part Number 1: C277528; Tolerance: ±5%; Voltage Rating: 50V; Temperature Coefficient: X7R; RoHS: Yes; ComponentLink1Description: Datasheet; ComponentLink1URL: https://wmsc.lcsc.com/wmsc/upload/file/pdf/v2/lcsc/2304140030_YAGEO-CC0603JRX7R9BB223_C277528.pdf; ComponentLink2Description: JLCPCB Part URL; ComponentLink2URL: https://jlcpcb.com/partdetail/C277528; ComponentLink3Description: LCSC Part URL; ComponentLink3URL: https://lcsc.com/product-detail/Multilayer-Ceramic-Capacitors-MLCC---SMD-SMT_YAGEO-YAGEO-CC0603JRX7R9BB223_C277528.html
footprint CAP-0603 (0603 (1608M) Capacitor)
pins: 1, 2

## CC0603JRX7R9BB224
designator C?  Capacitance: 220nF  (hidden comment: *)
Capacitor, Ceramic (MLCC), 220nF, ±5%, 50V, X7R, ±5%, SMD 0603; Manufacturer: YAGEO; Manufacturer Part Number: CC0603JRX7R9BB224; Package Size: 0603; JLCPCB Basic Part: No; JLCPCB Part Number: C519575; Supplier 1: LCSC; Category: Capacitors - MLCC; Supplier Part Number 1: C519575; Tolerance: ±5%; Voltage Rating: 50V; Temperature Coefficient: X7R; RoHS: Yes; ComponentLink1Description: Datasheet; ComponentLink1URL: https://wmsc.lcsc.com/wmsc/upload/file/pdf/v2/lcsc/2005141203_YAGEO-CC0603JRX7R9BB224_C519575.pdf; ComponentLink2Description: JLCPCB Part URL; ComponentLink2URL: https://jlcpcb.com/partdetail/C519575; ComponentLink3Description: LCSC Part URL; ComponentLink3URL: https://lcsc.com/product-detail/Multilayer-Ceramic-Capacitors-MLCC---SMD-SMT_YAGEO-YAGEO-CC0603JRX7R9BB224_C519575.html
footprint CAP-0603 (0603 (1608M) Capacitor)
pins: 1, 2

## CC0603JRX7R9BB271
designator C?  Capacitance: 270pF  (hidden comment: *)
Capacitor, Ceramic (MLCC), 270pF, ±5%, 50V, X7R, ±5%, SMD 0603; Manufacturer: YAGEO; Manufacturer Part Number: CC0603JRX7R9BB271; Package Size: 0603; JLCPCB Basic Part: No; JLCPCB Part Number: C519517; Supplier 1: LCSC; Category: Capacitors - MLCC; Supplier Part Number 1: C519517; Tolerance: ±5%; Voltage Rating: 50V; Temperature Coefficient: X7R; RoHS: Yes; ComponentLink1Description: Datasheet; ComponentLink1URL: https://wmsc.lcsc.com/wmsc/upload/file/pdf/v2/lcsc/2007161234_YAGEO-CC0603JRX7R9BB271_C519517.pdf; ComponentLink2Description: JLCPCB Part URL; ComponentLink2URL: https://jlcpcb.com/partdetail/C519517; ComponentLink3Description: LCSC Part URL; ComponentLink3URL: https://lcsc.com/product-detail/Multilayer-Ceramic-Capacitors-MLCC---SMD-SMT_YAGEO-YAGEO-CC0603JRX7R9BB271_C519517.html
footprint CAP-0603 (0603 (1608M) Capacitor)
pins: 1, 2

## CC0603JRX7R9BB272
designator C?  Capacitance: 2.7nF  (hidden comment: *)
Capacitor, Ceramic (MLCC), 2.7nF, ±5%, 50V, X7R, ±5%, SMD 0603; Manufacturer: YAGEO; Manufacturer Part Number: CC0603JRX7R9BB272; Package Size: 0603; JLCPCB Basic Part: No; JLCPCB Part Number: C519529; Supplier 1: LCSC; Category: Capacitors - MLCC; Supplier Part Number 1: C519529; Tolerance: ±5%; Voltage Rating: 50V; Temperature Coefficient: X7R; RoHS: Yes; ComponentLink1Description: Datasheet; ComponentLink1URL: https://wmsc.lcsc.com/wmsc/upload/file/pdf/v2/lcsc/2005141203_YAGEO-CC0603JRX7R9BB272_C519529.pdf; ComponentLink2Description: JLCPCB Part URL; ComponentLink2URL: https://jlcpcb.com/partdetail/C519529; ComponentLink3Description: LCSC Part URL; ComponentLink3URL: https://lcsc.com/product-detail/Multilayer-Ceramic-Capacitors-MLCC---SMD-SMT_YAGEO-YAGEO-CC0603JRX7R9BB272_C519529.html
footprint CAP-0603 (0603 (1608M) Capacitor)
pins: 1, 2

## CC0603JRX7R9BB273
designator C?  Capacitance: 27nF  (hidden comment: *)
Capacitor, Ceramic (MLCC), 27nF, ±5%, 50V, X7R, ±5%, SMD 0603; Manufacturer: YAGEO; Manufacturer Part Number: CC0603JRX7R9BB273; Package Size: 0603; JLCPCB Basic Part: No; JLCPCB Part Number: C519552; Supplier 1: LCSC; Category: Capacitors - MLCC; Supplier Part Number 1: C519552; Tolerance: ±5%; Voltage Rating: 50V; Temperature Coefficient: X7R; RoHS: Yes; ComponentLink1Description: Datasheet; ComponentLink1URL: https://wmsc.lcsc.com/wmsc/upload/file/pdf/v2/lcsc/2006011835_YAGEO-CC0603JRX7R9BB273_C519552.pdf; ComponentLink2Description: JLCPCB Part URL; ComponentLink2URL: https://jlcpcb.com/partdetail/C519552; ComponentLink3Description: LCSC Part URL; ComponentLink3URL: https://lcsc.com/product-detail/Multilayer-Ceramic-Capacitors-MLCC---SMD-SMT_YAGEO-YAGEO-CC0603JRX7R9BB273_C519552.html
footprint CAP-0603 (0603 (1608M) Capacitor)
pins: 1, 2

## CC0603JRX7R9BB331
designator C?  Capacitance: 330pF  (hidden comment: *)
Capacitor, Ceramic (MLCC), 330pF, ±5%, 50V, X7R, ±5%, SMD 0603; Manufacturer: YAGEO; Manufacturer Part Number: CC0603JRX7R9BB331; Package Size: 0603; JLCPCB Basic Part: No; JLCPCB Part Number: C309473; Supplier 1: LCSC; Category: Capacitors - MLCC; Supplier Part Number 1: C309473; Tolerance: ±5%; Voltage Rating: 50V; Temperature Coefficient: X7R; RoHS: Yes; ComponentLink1Description: Datasheet; ComponentLink1URL: https://wmsc.lcsc.com/wmsc/upload/file/pdf/v2/lcsc/2311211121_YAGEO-CC0603JRX7R9BB331_C309473.pdf; ComponentLink2Description: JLCPCB Part URL; ComponentLink2URL: https://jlcpcb.com/partdetail/C309473; ComponentLink3Description: LCSC Part URL; ComponentLink3URL: https://lcsc.com/product-detail/Multilayer-Ceramic-Capacitors-MLCC---SMD-SMT_YAGEO-YAGEO-CC0603JRX7R9BB331_C309473.html
footprint CAP-0603 (0603 (1608M) Capacitor)
pins: 1, 2

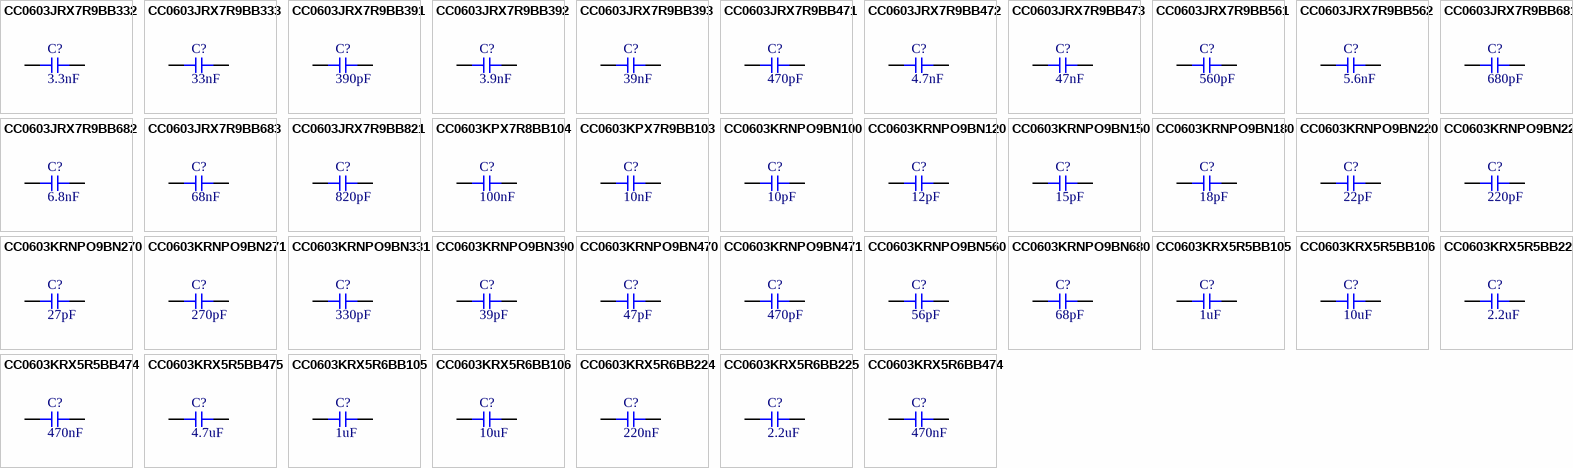
[diagram p44: symbols CC0603JRX7R9BB332 to CC0603KRX5R6BB474]

## CC0603JRX7R9BB332
designator C?  Capacitance: 3.3nF  (hidden comment: *)
Capacitor, Ceramic (MLCC), 3.3nF, ±5%, 50V, X7R, ±5%, SMD 0603; Manufacturer: YAGEO; Manufacturer Part Number: CC0603JRX7R9BB332; Package Size: 0603; JLCPCB Basic Part: No; JLCPCB Part Number: C519530; Supplier 1: LCSC; Category: Capacitors - MLCC; Supplier Part Number 1: C519530; Tolerance: ±5%; Voltage Rating: 50V; Temperature Coefficient: X7R; RoHS: Yes; ComponentLink1Description: Datasheet; ComponentLink1URL: https://wmsc.lcsc.com/wmsc/upload/file/pdf/v2/lcsc/2007161234_YAGEO-CC0603JRX7R9BB332_C519530.pdf; ComponentLink2Description: JLCPCB Part URL; ComponentLink2URL: https://jlcpcb.com/partdetail/C519530; ComponentLink3Description: LCSC Part URL; ComponentLink3URL: https://lcsc.com/product-detail/Multilayer-Ceramic-Capacitors-MLCC---SMD-SMT_YAGEO-YAGEO-CC0603JRX7R9BB332_C519530.html
footprint CAP-0603 (0603 (1608M) Capacitor)
pins: 1, 2

## CC0603JRX7R9BB333
designator C?  Capacitance: 33nF  (hidden comment: *)
Capacitor, Ceramic (MLCC), 33nF, ±5%, 50V, X7R, ±5%, SMD 0603; Manufacturer: YAGEO; Manufacturer Part Number: CC0603JRX7R9BB333; Package Size: 0603; JLCPCB Basic Part: No; JLCPCB Part Number: C327162; Supplier 1: LCSC; Category: Capacitors - MLCC; Supplier Part Number 1: C327162; Tolerance: ±5%; Voltage Rating: 50V; Temperature Coefficient: X7R; RoHS: Yes; ComponentLink1Description: Datasheet; ComponentLink1URL: https://wmsc.lcsc.com/wmsc/upload/file/pdf/v2/lcsc/1811141225_YAGEO-CC0603JRX7R9BB333_C327162.pdf; ComponentLink2Description: JLCPCB Part URL; ComponentLink2URL: https://jlcpcb.com/partdetail/C327162; ComponentLink3Description: LCSC Part URL; ComponentLink3URL: https://lcsc.com/product-detail/Multilayer-Ceramic-Capacitors-MLCC---SMD-SMT_YAGEO-YAGEO-CC0603JRX7R9BB333_C327162.html
footprint CAP-0603 (0603 (1608M) Capacitor)
pins: 1, 2
